# Altium footprint library PowerSupply.PcbLib: 67 footprints (part 3 of 5)
Each footprint in its own frame and in the unit in brackets; x right, y up, seen from the top. Pads: shape width x height; smd on the part's side, far side on the other; paste and mask are expansions set on the pad; w line width, h text height; cw(c..) or ccw(c..) is an arc to the next point about the centre after c.
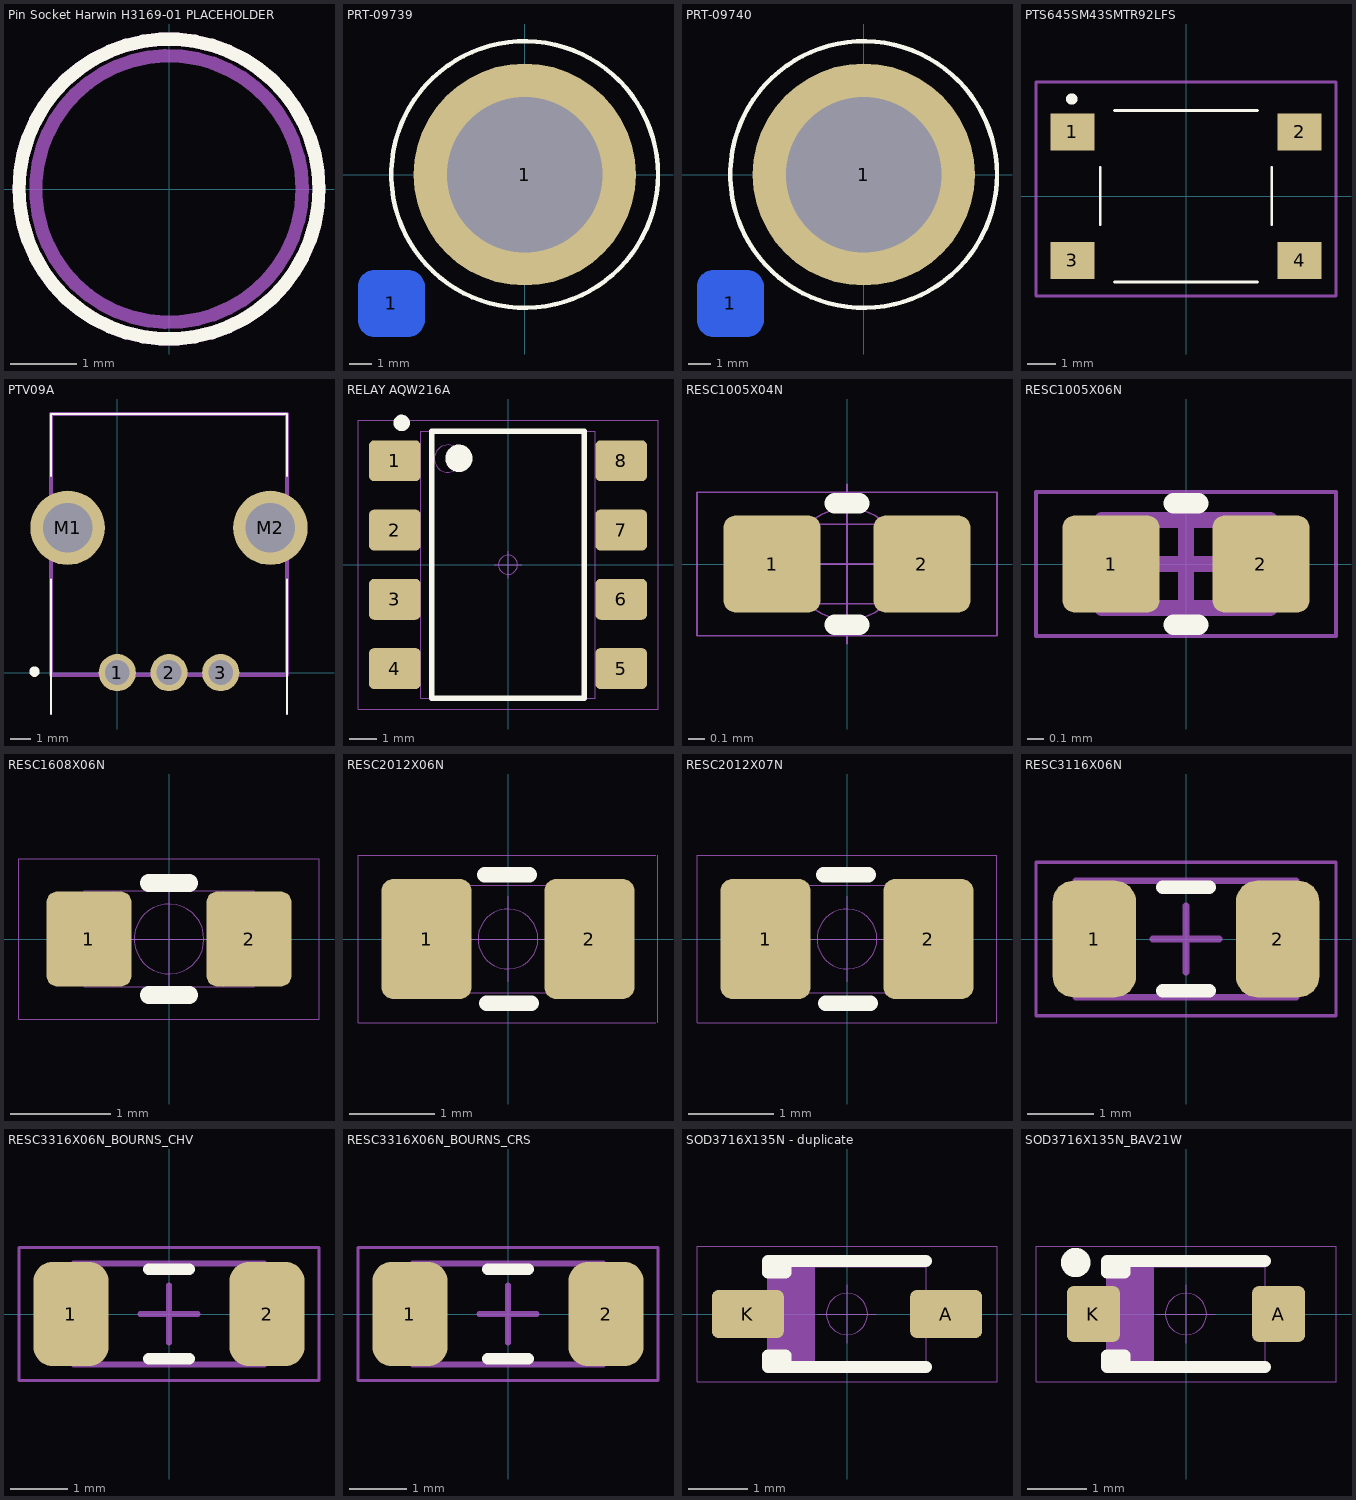
[diagram p2: the footprints below, top view; thin cyan lines are the x and y axes]

## Pin Socket Harwin H3169-01 PLACEHOLDER [mm] "Placeholder for Pin Socket Harwin H3169-01"
Top Overlay:
  circle w0.2: c0,0 r2.25
Top Assembly Drawing:
  circle w0.2: c0,0 r2
Top Assembly RefDes:
  text "'.Designator'" at -0.375,-0.325 h0.5
Top Courtyard:
  circle w0.2: c0,0 r2.25

## PRT-09739 [mm] "Binding Post Red"
pads (2):
  rrect50% 3x3 smd far side paste-1.27: 1(-6,-5.8)
  round 10 hole 7: 1(0,0)
Top Overlay:
  circle w0.2: c0,0 r6
3D body "Insulated Binding Post.STEP": height 29.41, standoff -18.52, extent -5.786,-5.8 5.7,5.686

## PRT-09740 [mm] "Binding Post Black"
pads (2):
  rrect50% 3x3 smd far side paste-1.27: 1(-6,-5.8)
  round 10 hole 7: 1(0,0)
Top Overlay:
  circle w0.2: c0,0 r6
3D body "Insulated Binding Post Black.STEP": height 29.41, standoff -18.52, extent -5.786,-5.8 5.7,5.686

## PTS645SM43SMTR92LFS [mm]
pads (4):
  rect 1.55x1.3 smd: 1(-3.975,2.25) 2(3.975,2.25) 3(-3.975,-2.25) 4(3.975,-2.25)
Top Overlay:
  lines w0.1: -3,-1 -3,1 ; -2.5,-3 2.5,-3 ; -2.5,3 2.5,3 ; 3,-1 3,1
  lines w0.2: -4.1,3.4 ccw(c-4,3.4) -3.9,3.4 ccw(c-4,3.4) -4.1,3.4
Top Courtyard:
  lines w0.1: -5.25,-3.5 5.25,-3.5 5.25,4 -5.25,4 -5.25,-3.5
3D body "PTS645SM43SMTR92LFS.stp": height 4.3, standoff 0, extent -4.5,-3 4.5,3

## PTV09A [mm] "POT 10K/500K"
pads (5):
  round 1.8 hole 1.2: 1(0,0) 2(2.5,0) 3(5,0)
  round 3.6 hole 2.4: M1(-2.4,7) M2(7.4,7)
Top Overlay:
  lines w0.1: -3.2,-2 -3.2,4.5 ; -3.2,9.5 -3.2,12.5 8.2,12.5 8.2,9.5 ; 8.2,-2 8.2,4.5
  lines w0.4: -4,0 cw(c-4,0.05) -4,0.1 cw(c-4,0.05) -4,0
3D Models:
  lines w0.2: -3.2,-0.1 -3.2,12.5 8.2,12.5 8.2,-0.1 -3.2,-0.1
3D body "ptv09a-4x20f-xxxx.stp": height 19.5, standoff -4.49, extent -3.2,-0.15 8.2,12.5

## RELAY AQW216A [mm] "Compact DIP8-pin type, SMD"
height 3.6
pads (8):
  rrect25% 1.9x1.5 smd mask+0.064: 1(-4.15,3.81) 2(-4.15,1.27) 3(-4.15,-1.27) 4(-4.15,-3.81) 5(4.15,-3.81) 6(4.15,-1.27) 7(4.15,1.27) 8(4.15,3.81)
Top Overlay:
  circle w0.3: c-3.9,5.2 r0.15
  circle w0.5: c-1.8,3.9 r0.25
  lines w0.2: -2.8,-4.89 2.8,-4.89 2.8,4.89 -2.8,4.89 -2.8,-4.89
Top Assembly Drawing:
  circle w0.01: c-2.2,3.89 r0.5
  lines w0.01: -3.2,-4.89 -3.2,4.89 3.2,4.89 3.2,-4.89 -3.2,-4.89
Top Assembly RefDes:
  text ".Designator" at -2.8,-1.1 h3
Top Courtyard:
  circle w0.01: c0,0 r0.35
  lines w0.01: -0.5,0 0.5,0 ; 0,-0.5 0,0.5 ; -5.5,-5.3 5.5,-5.3 5.5,5.3 -5.5,5.3 -5.5,-5.3
3D body: height 3.6, standoff 0.2, extent -3.2,-4.89 3.2,4.89

## RESC1005X04N [mil] "0402, Body 1.0x0.5x0.4mmmm, IPC Medium Density"
height 15.75
pads (2):
  rrect25% 24x24 smd paste+0 mask+2: 1(-18.5,0) 2(18.5,0)
Top Overlay:
  lines w5: -3.01,-15.01 2.99,-15.01 ; -3,15 3,15
Top Assembly Drawing:
  lines w0.39: -7.87,-9.84 -7.87,9.84 ; 7.87,-9.84 7.87,9.84 ; -21.65,-9.84 21.65,-9.84 21.65,9.84 -21.65,9.84 -21.65,-9.84
Top Assembly RefDes:
  text ".Designator" at -15.75,-3.94 h19.68
Top Courtyard:
  circle w0.39: c0,0 r13.78
  lines w0.39: -19.68,0 19.68,0 ; 0,-19.68 0,19.68 ; -37,-17.72 -37,17.72 37,17.72 37,-17.72 -37,-17.72
3D body "RESC1005X04N.step": height 15.75, standoff 0, extent -20.67,-10.82 20.67,10.83

## RESC1005X06N [mil] "0402, Body 1.00x0.50mx0.55m, IPC Medium Density"
height 21.65
pads (2):
  rrect25% 24x24 smd mask+2: 1(-18.5,0) 2(18.5,0)
Top Overlay:
  lines w5: -3.01,-15.01 2.99,-15.01 ; -3,15 3,15
Top Assembly Drawing:
  lines w3.94: -20.67,-10.83 20.67,-10.83 20.67,10.83 -20.67,10.83 -20.67,-10.83
Top Assembly RefDes:
  text "'.Designator'" at -9.84,-2.95 h4.92
Top Courtyard:
  lines w1: -37,-17.72 37,-17.72 37,17.72 -37,17.72 -37,-17.72
  lines w3.94: -10.83,0 10.83,0 ; 0,-10.83 0,10.83
3D body "RESC1005X06N.step": height 21.65, standoff 0, extent -20.67,-10.83 20.67,10.83

## RESC1608X06N [mm] "0603, Body 1.5x0.8x0.55mm, IPC Medium Density"
height 0.55
pads (2):
  rrect25% 0.85x0.95 smd paste+0 mask+0.064: 1(-0.8,0) 2(0.8,0)
Top Overlay:
  lines w0.178: -0.203,-0.559 0.203,-0.559 ; -0.203,0.559 0.203,0.559
Top Assembly Drawing:
  lines w0.01: -0.55,-0.48 -0.55,0.475 ; 0.55,-0.48 0.55,0.475 ; -0.85,-0.48 0.85,-0.48 0.85,0.48 -0.85,0.48 -0.85,-0.48
Top Assembly RefDes:
  text ".Designator" at -0.8,-0.3 h1
Top Courtyard:
  circle w0.01: c0,0 r0.35
  lines w0.01: -0.5,0 0.5,0 ; 0,-0.5 0,0.5 ; -1.5,-0.8 -1.5,0.8 1.5,0.8 1.5,-0.8 -1.5,-0.8
3D body "RESC1608X06N.step": height 0.55, standoff 0, extent -0.85,-0.45 0.85,0.45

## RESC2012X06N [mm] "0805, Body 2.0x1.3x0.6mm, IPC Medium Density"
height 0.6
pads (2):
  rrect25% 1.05x1.4 smd paste+0 mask+0.064: 1(-0.95,0) 2(0.95,0)
Top Overlay:
  lines w0.178: -0.275,0.75 0.25,0.75 ; -0.25,-0.75 0.275,-0.75
Top Assembly Drawing:
  lines w0.01: -0.8,-0.625 -0.8,0.625 ; 0.8,-0.625 0.8,0.625 ; -1.1,-0.625 -1.1,0.625 1.1,0.625 1.1,-0.625 -1.1,-0.625
Top Assembly RefDes:
  text "'.Designator'" at -0.8,-0.3 h0.5
Top Courtyard:
  circle w0.01: c0,0 r0.35
  lines w0.01: -0.5,0 0.5,0 ; 0,-0.5 0,0.5 ; 1.725,-0.975 -1.75,-0.975 -1.75,0.975 1.725,0.975 ; 1.75,-0.975 1.75,0.975
3D body "RESC2012X06N.step": height 0.6, standoff 0, extent -1.1,-0.675 1.1,0.675

## RESC2012X07N [mm] "0805, Body 2.0x1.3x0.7mm, IPC Medium Density"
height 0.7
pads (2):
  rrect25% 1.05x1.4 smd paste+0 mask+0.064: 1(-0.95,0) 2(0.95,0)
Top Overlay:
  lines w0.178: -0.275,0.75 0.25,0.75 ; -0.25,-0.75 0.275,-0.75
Top Assembly Drawing:
  lines w0.01: -0.8,-0.625 -0.8,0.625 ; 0.8,-0.625 0.8,0.625 ; -1.1,-0.625 1.1,-0.625 1.1,0.625 -1.1,0.625 -1.1,-0.625
Top Assembly RefDes:
  text "'.Designator'" at -0.8,-0.3 h0.5
Top Courtyard:
  circle w0.01: c0,0 r0.35
  lines w0.01: -0.5,0 0.5,0 ; 0,-0.5 0,0.5 ; -1.75,-0.975 1.75,-0.975 1.75,0.975 -1.75,0.975 -1.75,-0.975
3D body "RESC2012X07N.step": height 0.7, standoff 0, extent -1.1,-0.675 1.1,0.675

## RESC3116X06N [mm] "1206, Body 3.10x1.60x0.65mm, IPC Medium Density"
height 0.65
pads (2):
  rrect50% 1.25x1.75 smd: 1(-1.375,0) 2(1.375,0)
Top Overlay:
  lines w0.2: -0.35,-0.775 0.35,-0.775 ; -0.35,0.775 0.35,0.775
Top Assembly Drawing:
  lines w0.1: -1.65,-0.875 1.65,-0.875 1.65,0.875 -1.65,0.875 -1.65,-0.875
Top Assembly RefDes:
  text ".Designator" at -0.525,-0.2 h0.5
Top Courtyard:
  lines w0.05: -2.25,-1.15 2.25,-1.15 2.25,1.15 -2.25,1.15 -2.25,-1.15
  lines w0.1: -0.5,0 0.5,0 ; 0,-0.5 0,0.5
3D body "RESC3116X06N.step": height 0.65, standoff 0, extent -1.65,-0.875 1.65,0.875

## RESC3316X06N_BOURNS_CHV [mm] "1206, Body 3.20x1.60x0.65mm, IPC Medium Density, Bourns CHV Family"
height 0.65
pads (2):
  rrect50% 1.3x1.8 smd: 1(-1.7,0) 2(1.7,0)
Top Overlay:
  lines w0.2: -0.35,-0.775 0.35,-0.775 ; -0.35,0.775 0.35,0.775
Top Assembly Drawing:
  lines w0.1: -1.65,-0.875 1.65,-0.875 1.65,0.875 -1.65,0.875 -1.65,-0.875
Top Assembly RefDes:
  text ".Designator" at -0.525,-0.2 h0.5
Top Courtyard:
  lines w0.05: -2.6,-1.15 2.6,-1.15 2.6,1.15 -2.6,1.15 -2.6,-1.15
  lines w0.1: -0.5,0 0.5,0 ; 0,-0.5 0,0.5
3D body: height 0.6, standoff 0, extent -1.6,-0.8 1.6,0.8

## RESC3316X06N_BOURNS_CRS [mm] "1206, Body 3.20x1.60x0.65mm, IPC Medium Density, Bourns CRS Family"
height 0.65
pads (2):
  rrect50% 1.3x1.8 smd: 1(-1.7,0) 2(1.7,0)
Top Overlay:
  lines w0.2: -0.35,-0.775 0.35,-0.775 ; -0.35,0.775 0.35,0.775
Top Assembly Drawing:
  lines w0.1: -1.65,-0.875 -1.65,0.875 1.65,0.875 1.65,-0.875 -1.65,-0.875
Top Assembly RefDes:
  text ".Designator" at -0.525,-0.2 h0.5
Top Courtyard:
  lines w0.05: -2.6,-1.15 -2.6,1.15 2.6,1.15 2.6,-1.15 -2.6,-1.15
  lines w0.1: -0.5,0 0.5,0 ; 0,-0.5 0,0.5
3D body: height 0.6, standoff 0, extent -1.6,-0.8 1.6,0.8

## SOD3716X135N - duplicate [mm] "SOD123 2.69mm W X 1.60mm L X 1.35mm H body"
height 1.35
pads (2):
  rrect25% 1.22x0.81 smd mask+0.064: A(1.685,0) K(-1.685,0)
Top Overlay:
  lines w0.2: -1.045,-0.9 -1.045,-0.7 -1.345,-0.7 -1.345,-0.9 1.345,-0.9 ; -1.045,0.9 -1.045,0.7 -1.345,0.7 -1.345,0.9 1.345,0.9
Top Assembly Drawing:
  region: -1.345,0.8 -0.552,0.8 -0.552,-0.8 -1.345,-0.8
  lines w0.01: -1.345,-0.8 -1.345,0.8 1.345,0.8 1.345,-0.8 -1.345,-0.8
Top Assembly RefDes:
  text ".Designator" at -0.9,-0.2 h1
Top Courtyard:
  circle w0.01: c0,0 r0.35
  lines w0.01: -0.5,0 0.5,0 ; 0,-0.5 0,0.5 ; -2.55,-1.15 2.55,-1.15 2.55,1.15 -2.55,1.15 -2.55,-1.15
3D body "SOD-123.stp": height 1.35, standoff 0, extent -1.93,-0.902 1.93,0.902

## SOD3716X135N_BAV21W [mm] "SOD123 2.65x1.55x1.35mm Body"
height 1.35
pads (2):
  rrect25% 0.9x0.95 smd mask+0.064: A(1.575,0) K(-1.575,0)
Top Overlay:
  circle w0.25: c-1.875,0.875 r0.125
  lines w0.2: -1.045,-0.9 -1.045,-0.7 -1.345,-0.7 -1.345,-0.9 1.345,-0.9 ; -1.045,0.9 -1.045,0.7 -1.345,0.7 -1.345,0.9 1.345,0.9
Top Assembly Drawing:
  region: -1.345,0.8 -0.552,0.8 -0.552,-0.8 -1.345,-0.8
  lines w0.01: -1.345,-0.8 1.345,-0.8 1.345,0.8 -1.345,0.8 -1.345,-0.8
Top Assembly RefDes:
  text ".Designator" at -0.9,-0.2 h1
Top Courtyard:
  circle w0.01: c0,0 r0.35
  lines w0.01: -0.5,0 0.5,0 ; 0,-0.5 0,0.5 ; -2.55,-1.15 -2.55,1.15 2.55,1.15 2.55,-1.15 -2.55,-1.15
3D body "sod123 v4.step": height 1.2, standoff 0, extent -1.875,-0.85 1.875,0.85